# Altium footprint library Package_DIP.PcbLib: 236 footprints (part 14 of 15)
Each footprint in its own frame and in the unit in brackets; x right, y up, seen from the top. Pads: shape width x height; smd on the part's side, far side on the other; paste and mask are expansions set on the pad; w line width, h text height; cw(c..) or ccw(c..) is an arc to the next point about the centre after c.
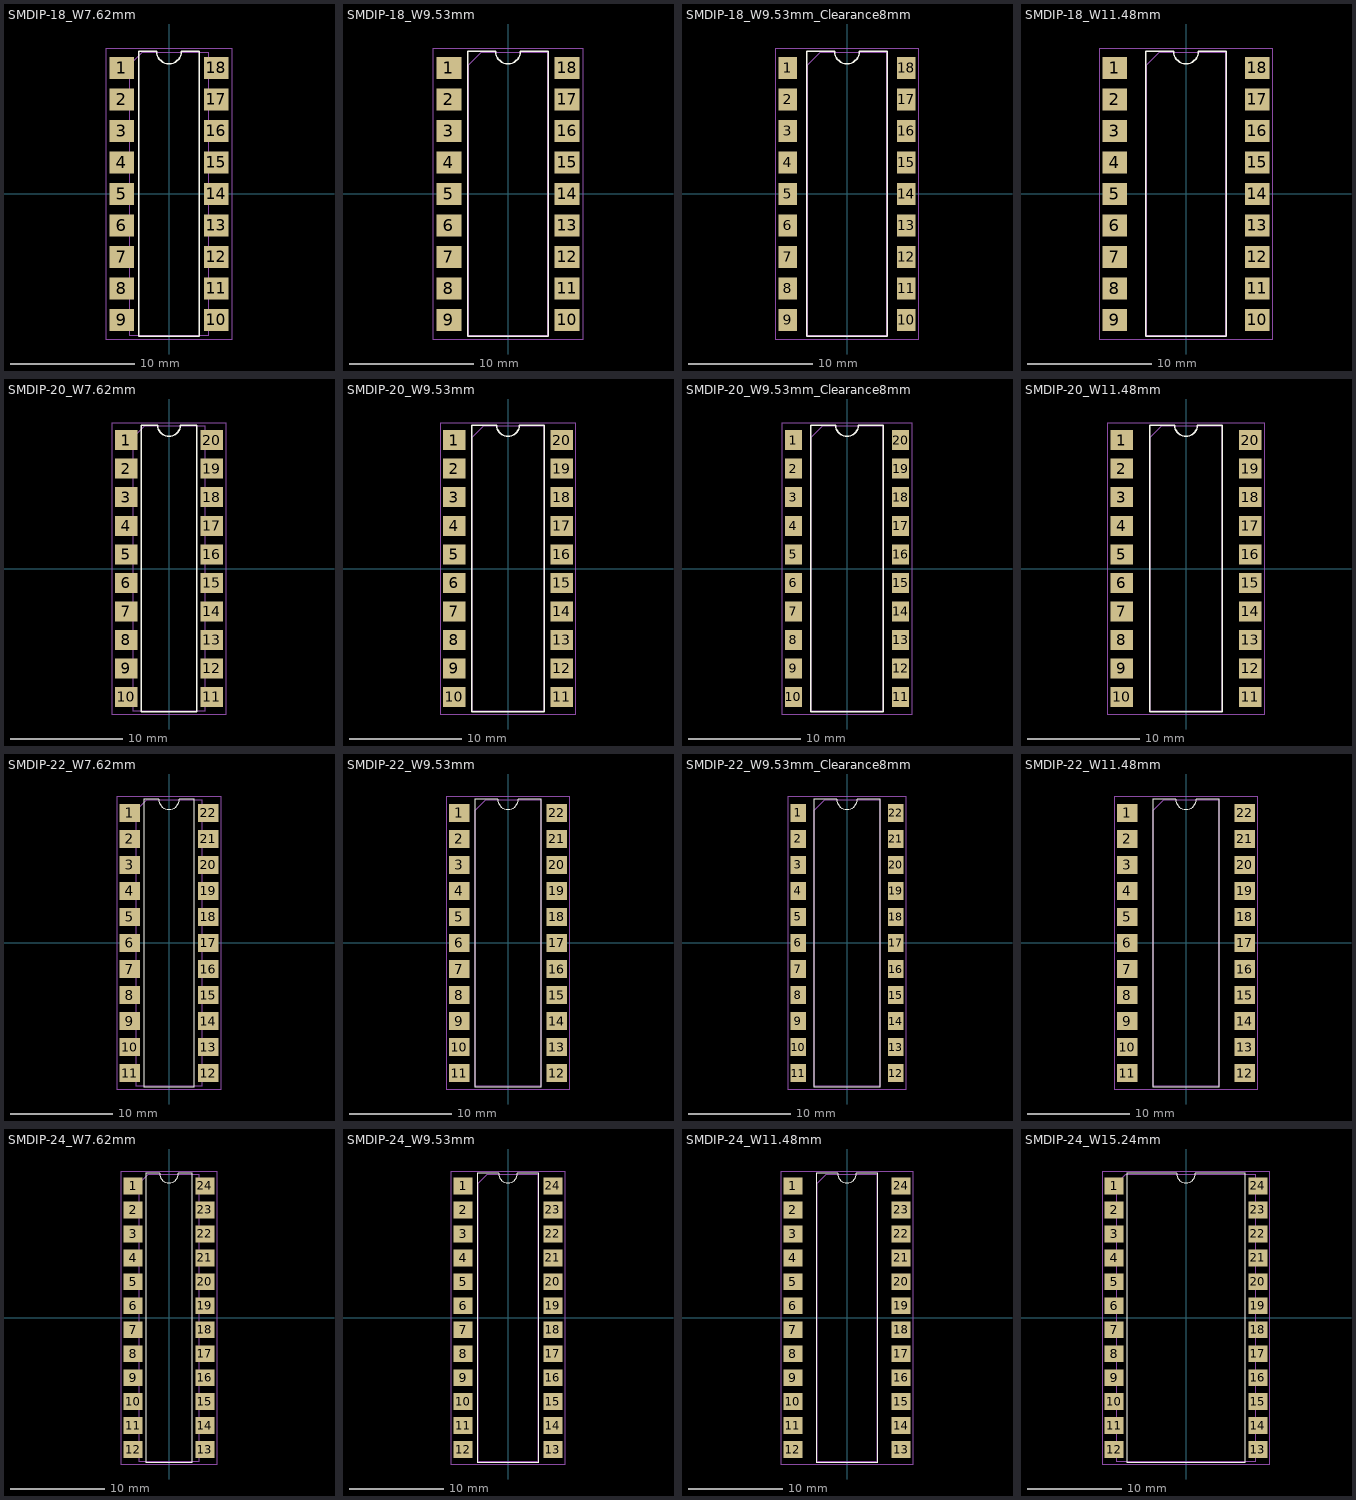
[diagram p13: the footprints below, top view; thin cyan lines are the x and y axes]

## SMDIP-18_W7.62mm [mm]
pads (18):
  rect 2x1.78 smd: 1(-3.81,10.16) 2(-3.81,7.62) 3(-3.81,5.08) 4(-3.81,2.54) 5(-3.81,0) 6(-3.81,-2.54) 7(-3.81,-5.08) 8(-3.81,-7.62) 9(-3.81,-10.16) 10(3.81,-10.16) 11(3.81,-7.62) 12(3.81,-5.08) 13(3.81,-2.54) 14(3.81,0) 15(3.81,2.54) 16(3.81,5.08) 17(3.81,7.62) 18(3.81,10.16)
F.SilkS:
  lines w0.12: -2.45,-11.49 -2.45,11.49 -1,11.49 ccw(c0,11.49) 1,11.49 2.45,11.49 2.45,-11.49 -2.45,-11.49
F.CrtYd:
  lines w0.05: -5.1,-11.7 -5.1,11.7 5.1,11.7 5.1,-11.7 -5.1,-11.7
F.Fab:
  lines w0.1: -3.175,-11.43 3.175,-11.43 3.175,11.43 -2.175,11.43 -3.175,10.43 -3.175,-11.43
  text "'.Designator'" at -4.047,-0.84 h1

## SMDIP-18_W9.53mm [mm]
pads (18):
  rect 2x1.78 smd: 1(-4.765,10.16) 2(-4.765,7.62) 3(-4.765,5.08) 4(-4.765,2.54) 5(-4.765,0) 6(-4.765,-2.54) 7(-4.765,-5.08) 8(-4.765,-7.62) 9(-4.765,-10.16) 10(4.765,-10.16) 11(4.765,-7.62) 12(4.765,-5.08) 13(4.765,-2.54) 14(4.765,0) 15(4.765,2.54) 16(4.765,5.08) 17(4.765,7.62) 18(4.765,10.16)
F.SilkS:
  lines w0.12: -3.235,-11.49 -3.235,11.49 -1,11.49 ccw(c0,11.49) 1,11.49 3.235,11.49 3.235,-11.49 -3.235,-11.49
F.CrtYd:
  lines w0.05: -6.05,-11.7 -6.05,11.7 6.05,11.7 6.05,-11.7 -6.05,-11.7
F.Fab:
  lines w0.1: -3.175,-11.43 3.175,-11.43 3.175,11.43 -2.175,11.43 -3.175,10.43 -3.175,-11.43
  text "'.Designator'" at -4.047,-0.84 h1

## SMDIP-18_W9.53mm_Clearance8mm [mm]
pads (18):
  rect 1.5x1.78 smd: 1(-4.765,10.16) 2(-4.765,7.62) 3(-4.765,5.08) 4(-4.765,2.54) 5(-4.765,0) 6(-4.765,-2.54) 7(-4.765,-5.08) 8(-4.765,-7.62) 9(-4.765,-10.16) 10(4.765,-10.16) 11(4.765,-7.62) 12(4.765,-5.08) 13(4.765,-2.54) 14(4.765,0) 15(4.765,2.54) 16(4.765,5.08) 17(4.765,7.62) 18(4.765,10.16)
F.SilkS:
  lines w0.12: -3.235,-11.49 3.235,-11.49 3.235,11.49 1,11.49 cw(c0,11.49) -1,11.49 -3.235,11.49 -3.235,-11.49
F.CrtYd:
  lines w0.05: -5.8,-11.7 -5.8,11.7 5.8,11.7 5.8,-11.7 -5.8,-11.7
F.Fab:
  lines w0.1: -3.175,-11.43 -3.175,10.43 -2.175,11.43 3.175,11.43 3.175,-11.43 -3.175,-11.43
  text "'.Designator'" at -4.047,-0.84 h1

## SMDIP-18_W11.48mm [mm]
pads (18):
  rect 2x1.78 smd: 1(-5.74,10.16) 2(-5.74,7.62) 3(-5.74,5.08) 4(-5.74,2.54) 5(-5.74,0) 6(-5.74,-2.54) 7(-5.74,-5.08) 8(-5.74,-7.62) 9(-5.74,-10.16) 10(5.74,-10.16) 11(5.74,-7.62) 12(5.74,-5.08) 13(5.74,-2.54) 14(5.74,0) 15(5.74,2.54) 16(5.74,5.08) 17(5.74,7.62) 18(5.74,10.16)
F.SilkS:
  lines w0.12: -3.235,-11.49 3.235,-11.49 3.235,11.49 1,11.49 cw(c0,11.49) -1,11.49 -3.235,11.49 -3.235,-11.49
F.CrtYd:
  lines w0.05: -7,-11.7 -7,11.7 7,11.7 7,-11.7 -7,-11.7
F.Fab:
  lines w0.1: -3.175,-11.43 -3.175,10.43 -2.175,11.43 3.175,11.43 3.175,-11.43 -3.175,-11.43
  text "'.Designator'" at -4.047,-0.84 h1

## SMDIP-20_W7.62mm [mm]
pads (20):
  rect 2x1.78 smd: 1(-3.81,11.43) 2(-3.81,8.89) 3(-3.81,6.35) 4(-3.81,3.81) 5(-3.81,1.27) 6(-3.81,-1.27) 7(-3.81,-3.81) 8(-3.81,-6.35) 9(-3.81,-8.89) 10(-3.81,-11.43) 11(3.81,-11.43) 12(3.81,-8.89) 13(3.81,-6.35) 14(3.81,-3.81) 15(3.81,-1.27) 16(3.81,1.27) 17(3.81,3.81) 18(3.81,6.35) 19(3.81,8.89) 20(3.81,11.43)
F.SilkS:
  lines w0.12: -2.45,-12.76 -2.45,12.76 -1,12.76 ccw(c0,12.76) 1,12.76 2.45,12.76 2.45,-12.76 -2.45,-12.76
F.CrtYd:
  lines w0.05: -5.1,-12.95 5.1,-12.95 5.1,12.95 -5.1,12.95 -5.1,-12.95
F.Fab:
  lines w0.1: -3.175,-12.7 -3.175,11.7 -2.175,12.7 3.175,12.7 3.175,-12.7 -3.175,-12.7
  text "'.Designator'" at -4.047,-0.84 h1

## SMDIP-20_W9.53mm [mm]
pads (20):
  rect 2x1.78 smd: 1(-4.765,11.43) 2(-4.765,8.89) 3(-4.765,6.35) 4(-4.765,3.81) 5(-4.765,1.27) 6(-4.765,-1.27) 7(-4.765,-3.81) 8(-4.765,-6.35) 9(-4.765,-8.89) 10(-4.765,-11.43) 11(4.765,-11.43) 12(4.765,-8.89) 13(4.765,-6.35) 14(4.765,-3.81) 15(4.765,-1.27) 16(4.765,1.27) 17(4.765,3.81) 18(4.765,6.35) 19(4.765,8.89) 20(4.765,11.43)
F.SilkS:
  lines w0.12: -3.235,-12.76 3.235,-12.76 3.235,12.76 1,12.76 cw(c0,12.76) -1,12.76 -3.235,12.76 -3.235,-12.76
F.CrtYd:
  lines w0.05: -6.05,-12.95 -6.05,12.95 6.05,12.95 6.05,-12.95 -6.05,-12.95
F.Fab:
  lines w0.1: -3.175,-12.7 3.175,-12.7 3.175,12.7 -2.175,12.7 -3.175,11.7 -3.175,-12.7
  text "'.Designator'" at -4.047,-0.84 h1

## SMDIP-20_W9.53mm_Clearance8mm [mm]
pads (20):
  rect 1.5x1.78 smd: 1(-4.765,11.43) 2(-4.765,8.89) 3(-4.765,6.35) 4(-4.765,3.81) 5(-4.765,1.27) 6(-4.765,-1.27) 7(-4.765,-3.81) 8(-4.765,-6.35) 9(-4.765,-8.89) 10(-4.765,-11.43) 11(4.765,-11.43) 12(4.765,-8.89) 13(4.765,-6.35) 14(4.765,-3.81) 15(4.765,-1.27) 16(4.765,1.27) 17(4.765,3.81) 18(4.765,6.35) 19(4.765,8.89) 20(4.765,11.43)
F.SilkS:
  lines w0.12: -3.235,-12.76 -3.235,12.76 -1,12.76 ccw(c0,12.76) 1,12.76 3.235,12.76 3.235,-12.76 -3.235,-12.76
F.CrtYd:
  lines w0.05: -5.8,-12.95 5.8,-12.95 5.8,12.95 -5.8,12.95 -5.8,-12.95
F.Fab:
  lines w0.1: -3.175,-12.7 -3.175,11.7 -2.175,12.7 3.175,12.7 3.175,-12.7 -3.175,-12.7
  text "'.Designator'" at -4.047,-0.84 h1

## SMDIP-20_W11.48mm [mm]
pads (20):
  rect 2x1.78 smd: 1(-5.74,11.43) 2(-5.74,8.89) 3(-5.74,6.35) 4(-5.74,3.81) 5(-5.74,1.27) 6(-5.74,-1.27) 7(-5.74,-3.81) 8(-5.74,-6.35) 9(-5.74,-8.89) 10(-5.74,-11.43) 11(5.74,-11.43) 12(5.74,-8.89) 13(5.74,-6.35) 14(5.74,-3.81) 15(5.74,-1.27) 16(5.74,1.27) 17(5.74,3.81) 18(5.74,6.35) 19(5.74,8.89) 20(5.74,11.43)
F.SilkS:
  lines w0.12: -3.235,-12.76 -3.235,12.76 -1,12.76 ccw(c0,12.76) 1,12.76 3.235,12.76 3.235,-12.76 -3.235,-12.76
F.CrtYd:
  lines w0.05: -7,-12.95 -7,12.95 7,12.95 7,-12.95 -7,-12.95
F.Fab:
  lines w0.1: -3.175,-12.7 -3.175,11.7 -2.175,12.7 3.175,12.7 3.175,-12.7 -3.175,-12.7
  text "'.Designator'" at -4.047,-0.84 h1

## SMDIP-22_W7.62mm [mm]
pads (22):
  rect 2x1.78 smd: 1(-3.81,12.7) 2(-3.81,10.16) 3(-3.81,7.62) 4(-3.81,5.08) 5(-3.81,2.54) 6(-3.81,0) 7(-3.81,-2.54) 8(-3.81,-5.08) 9(-3.81,-7.62) 10(-3.81,-10.16) 11(-3.81,-12.7) 12(3.81,-12.7) 13(3.81,-10.16) 14(3.81,-7.62) 15(3.81,-5.08) 16(3.81,-2.54) 17(3.81,0) 18(3.81,2.54) 19(3.81,5.08) 20(3.81,7.62) 21(3.81,10.16) 22(3.81,12.7)
F.SilkS:
  lines w0.12: -2.45,-14.03 2.45,-14.03 2.45,14.03 1,14.03 cw(c0,14.03) -1,14.03 -2.45,14.03 -2.45,-14.03
F.CrtYd:
  lines w0.05: -5.1,-14.25 -5.1,14.25 5.1,14.25 5.1,-14.25 -5.1,-14.25
F.Fab:
  lines w0.1: -3.175,-13.97 3.175,-13.97 3.175,13.97 -2.175,13.97 -3.175,12.97 -3.175,-13.97
  text "'.Designator'" at -4.047,-0.84 h1

## SMDIP-22_W9.53mm [mm]
pads (22):
  rect 2x1.78 smd: 1(-4.765,12.7) 2(-4.765,10.16) 3(-4.765,7.62) 4(-4.765,5.08) 5(-4.765,2.54) 6(-4.765,0) 7(-4.765,-2.54) 8(-4.765,-5.08) 9(-4.765,-7.62) 10(-4.765,-10.16) 11(-4.765,-12.7) 12(4.765,-12.7) 13(4.765,-10.16) 14(4.765,-7.62) 15(4.765,-5.08) 16(4.765,-2.54) 17(4.765,0) 18(4.765,2.54) 19(4.765,5.08) 20(4.765,7.62) 21(4.765,10.16) 22(4.765,12.7)
F.SilkS:
  lines w0.12: -3.235,-14.03 -3.235,14.03 -1,14.03 ccw(c0,14.03) 1,14.03 3.235,14.03 3.235,-14.03 -3.235,-14.03
F.CrtYd:
  lines w0.05: -6.05,-14.25 6.05,-14.25 6.05,14.25 -6.05,14.25 -6.05,-14.25
F.Fab:
  lines w0.1: -3.175,-13.97 -3.175,12.97 -2.175,13.97 3.175,13.97 3.175,-13.97 -3.175,-13.97
  text "'.Designator'" at -4.047,-0.84 h1

## SMDIP-22_W9.53mm_Clearance8mm [mm]
pads (22):
  rect 1.5x1.78 smd: 1(-4.765,12.7) 2(-4.765,10.16) 3(-4.765,7.62) 4(-4.765,5.08) 5(-4.765,2.54) 6(-4.765,0) 7(-4.765,-2.54) 8(-4.765,-5.08) 9(-4.765,-7.62) 10(-4.765,-10.16) 11(-4.765,-12.7) 12(4.765,-12.7) 13(4.765,-10.16) 14(4.765,-7.62) 15(4.765,-5.08) 16(4.765,-2.54) 17(4.765,0) 18(4.765,2.54) 19(4.765,5.08) 20(4.765,7.62) 21(4.765,10.16) 22(4.765,12.7)
F.SilkS:
  lines w0.12: -3.235,-14.03 3.235,-14.03 3.235,14.03 1,14.03 cw(c0,14.03) -1,14.03 -3.235,14.03 -3.235,-14.03
F.CrtYd:
  lines w0.05: -5.8,-14.25 -5.8,14.25 5.8,14.25 5.8,-14.25 -5.8,-14.25
F.Fab:
  lines w0.1: -3.175,-13.97 -3.175,12.97 -2.175,13.97 3.175,13.97 3.175,-13.97 -3.175,-13.97
  text "'.Designator'" at -4.047,-0.84 h1

## SMDIP-22_W11.48mm [mm]
pads (22):
  rect 2x1.78 smd: 1(-5.74,12.7) 2(-5.74,10.16) 3(-5.74,7.62) 4(-5.74,5.08) 5(-5.74,2.54) 6(-5.74,0) 7(-5.74,-2.54) 8(-5.74,-5.08) 9(-5.74,-7.62) 10(-5.74,-10.16) 11(-5.74,-12.7) 12(5.74,-12.7) 13(5.74,-10.16) 14(5.74,-7.62) 15(5.74,-5.08) 16(5.74,-2.54) 17(5.74,0) 18(5.74,2.54) 19(5.74,5.08) 20(5.74,7.62) 21(5.74,10.16) 22(5.74,12.7)
F.SilkS:
  lines w0.12: -3.235,-14.03 3.235,-14.03 3.235,14.03 1,14.03 cw(c0,14.03) -1,14.03 -3.235,14.03 -3.235,-14.03
F.CrtYd:
  lines w0.05: -7,-14.25 7,-14.25 7,14.25 -7,14.25 -7,-14.25
F.Fab:
  lines w0.1: -3.175,-13.97 -3.175,12.97 -2.175,13.97 3.175,13.97 3.175,-13.97 -3.175,-13.97
  text "'.Designator'" at -4.047,-0.84 h1

## SMDIP-24_W7.62mm [mm]
pads (24):
  rect 2x1.78 smd: 1(-3.81,13.97) 2(-3.81,11.43) 3(-3.81,8.89) 4(-3.81,6.35) 5(-3.81,3.81) 6(-3.81,1.27) 7(-3.81,-1.27) 8(-3.81,-3.81) 9(-3.81,-6.35) 10(-3.81,-8.89) 11(-3.81,-11.43) 12(-3.81,-13.97) 13(3.81,-13.97) 14(3.81,-11.43) 15(3.81,-8.89) 16(3.81,-6.35) 17(3.81,-3.81) 18(3.81,-1.27) 19(3.81,1.27) 20(3.81,3.81) 21(3.81,6.35) 22(3.81,8.89) 23(3.81,11.43) 24(3.81,13.97)
F.SilkS:
  lines w0.12: -2.45,-15.3 2.45,-15.3 2.45,15.3 1,15.3 cw(c0,15.3) -1,15.3 -2.45,15.3 -2.45,-15.3
F.CrtYd:
  lines w0.05: -5.1,-15.5 5.1,-15.5 5.1,15.5 -5.1,15.5 -5.1,-15.5
F.Fab:
  lines w0.1: -3.175,-15.24 3.175,-15.24 3.175,15.24 -2.175,15.24 -3.175,14.24 -3.175,-15.24
  text "'.Designator'" at -4.047,-0.84 h1

## SMDIP-24_W9.53mm [mm]
pads (24):
  rect 2x1.78 smd: 1(-4.765,13.97) 2(-4.765,11.43) 3(-4.765,8.89) 4(-4.765,6.35) 5(-4.765,3.81) 6(-4.765,1.27) 7(-4.765,-1.27) 8(-4.765,-3.81) 9(-4.765,-6.35) 10(-4.765,-8.89) 11(-4.765,-11.43) 12(-4.765,-13.97) 13(4.765,-13.97) 14(4.765,-11.43) 15(4.765,-8.89) 16(4.765,-6.35) 17(4.765,-3.81) 18(4.765,-1.27) 19(4.765,1.27) 20(4.765,3.81) 21(4.765,6.35) 22(4.765,8.89) 23(4.765,11.43) 24(4.765,13.97)
F.SilkS:
  lines w0.12: -3.235,-15.3 -3.235,15.3 -1,15.3 ccw(c0,15.3) 1,15.3 3.235,15.3 3.235,-15.3 -3.235,-15.3
F.CrtYd:
  lines w0.05: -6.05,-15.5 -6.05,15.5 6.05,15.5 6.05,-15.5 -6.05,-15.5
F.Fab:
  lines w0.1: -3.175,-15.24 -3.175,14.24 -2.175,15.24 3.175,15.24 3.175,-15.24 -3.175,-15.24
  text "'.Designator'" at -4.047,-0.84 h1

## SMDIP-24_W11.48mm [mm]
pads (24):
  rect 2x1.78 smd: 1(-5.74,13.97) 2(-5.74,11.43) 3(-5.74,8.89) 4(-5.74,6.35) 5(-5.74,3.81) 6(-5.74,1.27) 7(-5.74,-1.27) 8(-5.74,-3.81) 9(-5.74,-6.35) 10(-5.74,-8.89) 11(-5.74,-11.43) 12(-5.74,-13.97) 13(5.74,-13.97) 14(5.74,-11.43) 15(5.74,-8.89) 16(5.74,-6.35) 17(5.74,-3.81) 18(5.74,-1.27) 19(5.74,1.27) 20(5.74,3.81) 21(5.74,6.35) 22(5.74,8.89) 23(5.74,11.43) 24(5.74,13.97)
F.SilkS:
  lines w0.12: -3.235,-15.3 -3.235,15.3 -1,15.3 ccw(c0,15.3) 1,15.3 3.235,15.3 3.235,-15.3 -3.235,-15.3
F.CrtYd:
  lines w0.05: -7,-15.5 7,-15.5 7,15.5 -7,15.5 -7,-15.5
F.Fab:
  lines w0.1: -3.175,-15.24 -3.175,14.24 -2.175,15.24 3.175,15.24 3.175,-15.24 -3.175,-15.24
  text "'.Designator'" at -4.047,-0.84 h1

## SMDIP-24_W15.24mm [mm]
pads (24):
  rect 2x1.78 smd: 1(-7.62,13.97) 2(-7.62,11.43) 3(-7.62,8.89) 4(-7.62,6.35) 5(-7.62,3.81) 6(-7.62,1.27) 7(-7.62,-1.27) 8(-7.62,-3.81) 9(-7.62,-6.35) 10(-7.62,-8.89) 11(-7.62,-11.43) 12(-7.62,-13.97) 13(7.62,-13.97) 14(7.62,-11.43) 15(7.62,-8.89) 16(7.62,-6.35) 17(7.62,-3.81) 18(7.62,-1.27) 19(7.62,1.27) 20(7.62,3.81) 21(7.62,6.35) 22(7.62,8.89) 23(7.62,11.43) 24(7.62,13.97)
F.SilkS:
  lines w0.12: -6.26,-15.3 6.26,-15.3 6.26,15.3 1,15.3 cw(c0,15.3) -1,15.3 -6.26,15.3 -6.26,-15.3
F.CrtYd:
  lines w0.05: -8.9,-15.5 8.9,-15.5 8.9,15.5 -8.9,15.5 -8.9,-15.5
F.Fab:
  lines w0.1: -7.365,-15.24 7.365,-15.24 7.365,15.24 -6.365,15.24 -7.365,14.24 -7.365,-15.24
  text "'.Designator'" at -4.047,-0.84 h1